# Altium footprint library SensorCard.PcbLib: 61 footprints (part 3 of 4)
Each footprint in its own frame and in the unit in brackets; x right, y up, seen from the top. Pads: shape width x height; smd on the part's side, far side on the other; paste and mask are expansions set on the pad; w line width, h text height; cw(c..) or ccw(c..) is an arc to the next point about the centre after c.
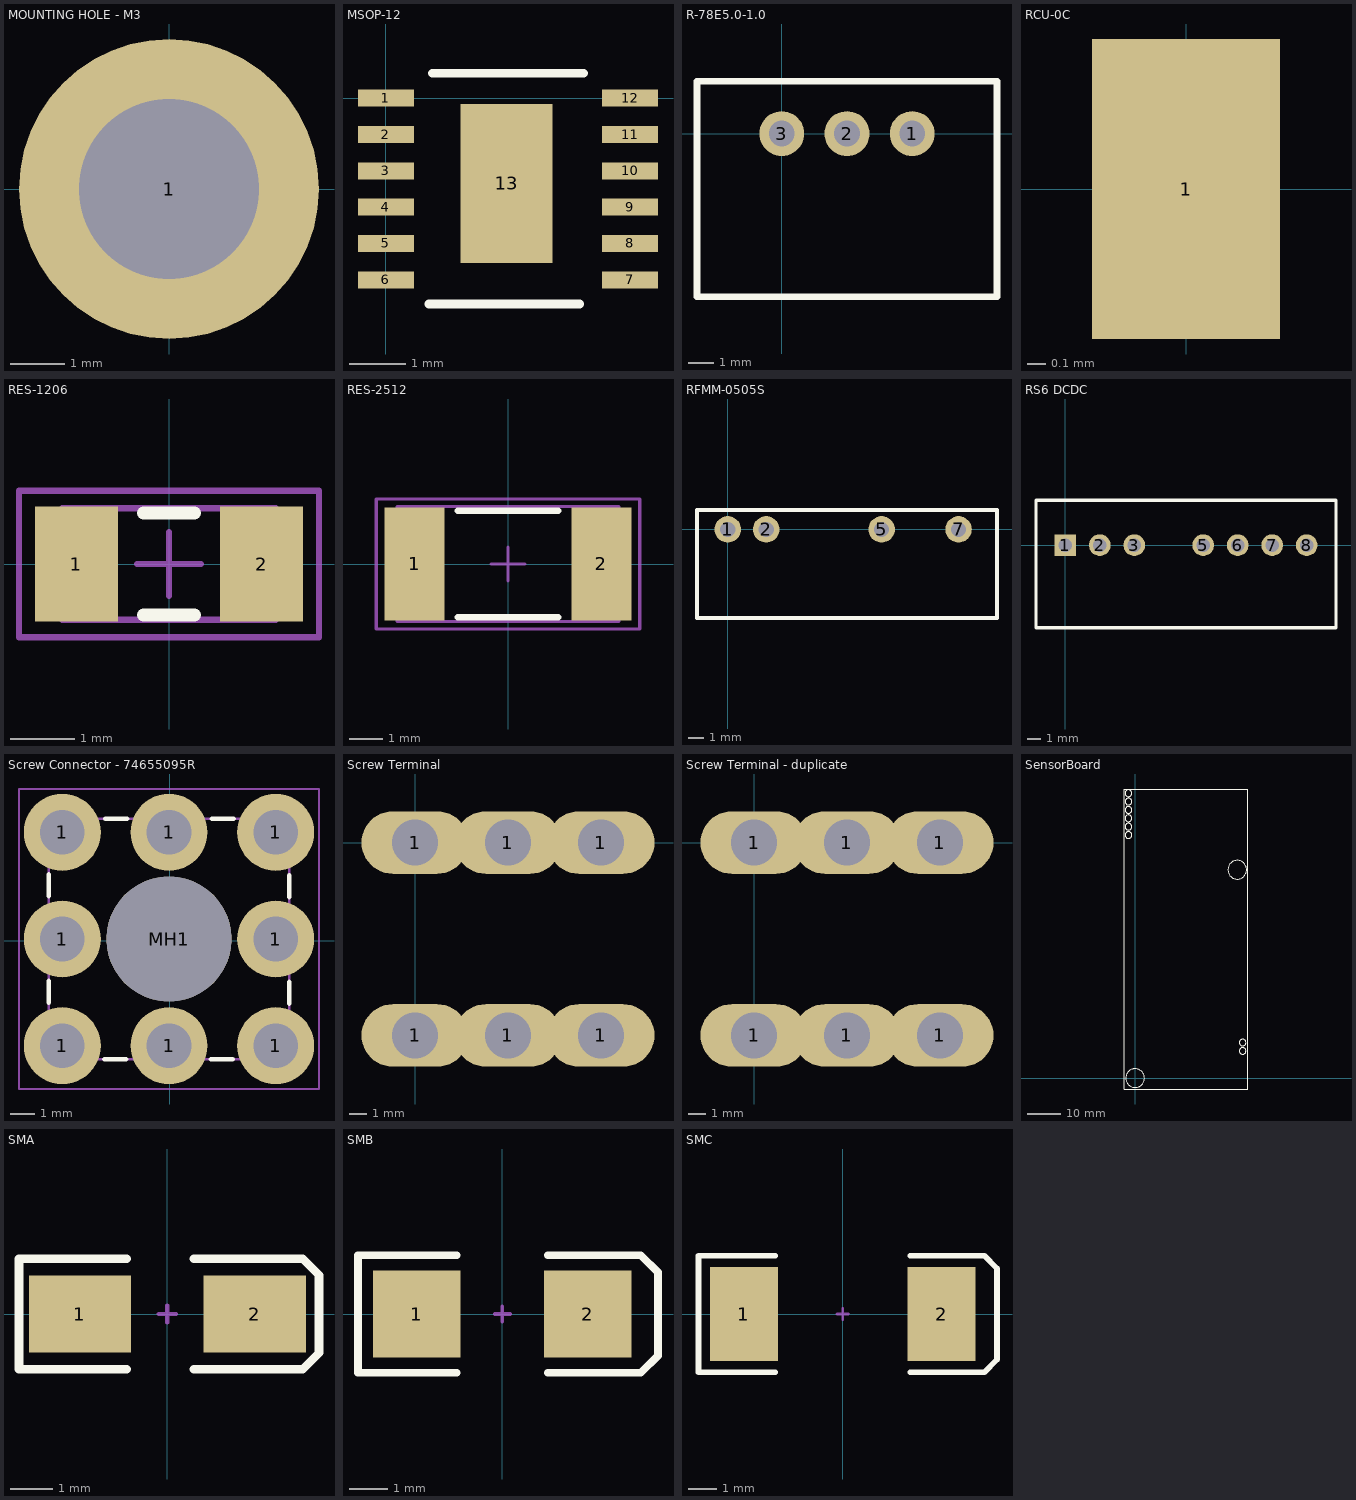
[diagram p2: the footprints below, top view; thin cyan lines are the x and y axes]

## MOUNTING HOLE - M3 [mm]
pads (1):
  round 5.5 hole 3.3: 1(0,0)

## MSOP-12 [mm]
pads (13):
  rect 1x0.305 smd paste+0: 1(0,0) 2(0,-0.65) 3(0,-1.3) 4(0,-1.95) 5(0,-2.6) 6(0,-3.25) 7(4.369,-3.25) 8(4.369,-2.6) 9(4.369,-1.95) 10(4.369,-1.3) 11(4.369,-0.65) 12(4.369,0)
  rect 1.651x2.845 smd paste+0: 13(2.159,-1.524)
Top Overlay:
  lines w0.152: 0.762,-3.683 3.473,-3.683 ; 0.829,0.446 3.54,0.446
  text "." at -0.127,0.254 h1.78
3D body "User Library-msop-12.step": height 1.1, standoff 0, extent -0.27,-3.62 4.63,0.42
3D body: height 0.25, standoff 0, extent 2.184,-1.751 2.438,-1.497

## R-78E5.0-1.0 [mm] "DC/DC Converter"
height 10.4
pads (3):
  round 1.75 hole 1: 1(5.08,0) 2(2.54,0) 3(0,0)
Top Overlay:
  lines w0.254: -3.302,-6.35 -3.302,2.032 8.382,2.032 8.382,-6.35 -3.302,-6.35
3D body: height 10.4, standoff 0, extent -3.175,-6.223 8.255,1.905

## RCU-0C [mm] "0603 PROBE PAD"
pads (1):
  rect 1x1.6 smd: 1(0,0)
3D body "c-1625854-3-ba-3d.stp": height 1.12, standoff -0.03, extent -0.443,-0.8 0.457,0.8

## RES-1206 [mm] "Chip Resistor, Body 3.2x1.6mm, IPC Medium Density"
height 0.71
pads (2):
  rect 1.3x1.8 smd: 1(-1.45,0) 2(1.45,0)
Top Overlay:
  lines w0.2: -0.4,-0.8 0.4,-0.8 ; -0.4,0.8 0.4,0.8
Mechanical 13:
  lines w0.1: -1.675,-0.875 1.675,-0.875 1.675,0.875 -1.675,0.875 -1.675,-0.875
Mechanical 15:
  lines w0.1: -0.5,0 0.5,0 ; 0,-0.5 0,0.5 ; -2.35,-1.15 2.35,-1.15 2.35,1.15 -2.35,1.15 -2.35,-1.15
3D body "User Library-CR3216-1206.step": height 0.6, standoff 0, extent -1.6,-0.8 1.6,0.8

## RES-2512 [mm] "Chip Resistor, Body 6.4x3.2mm, IPC Medium Density"
height 1.1
pads (2):
  rect 1.8x3.4 smd: 1(-2.8,0) 2(2.8,0)
Top Overlay:
  lines w0.2: -1.5,-1.6 1.5,-1.6 ; -1.5,1.6 1.5,1.6
Mechanical 13:
  lines w0.1: -3.325,-1.725 -3.325,1.725 3.325,1.725 3.325,-1.725 -3.325,-1.725
Mechanical 15:
  lines w0.1: -0.5,0 0.5,0 ; 0,-0.5 0,0.5 ; -3.95,-1.95 -3.95,1.95 3.95,1.95 3.95,-1.95 -3.95,-1.95
3D body "RESC-2512.STEP": height 0.57, standoff -0.03, extent -3.15,-1.626 3.15,1.524

## RFMM-0505S [mm] "DC/DC Converter"
height 10.4
pads (4):
  round 1.75 hole 1: 1(0,0) 2(2.54,0) 5(10.16,0) 7(15.24,0)
Top Overlay:
  lines w0.254: -2.032,-5.842 17.78,-5.842 17.78,1.27 -2.032,1.27 -2.032,-5.842
3D body: height 10.2, standoff 0, extent -2.032,-5.842 17.78,1.27

## RS6 DCDC [mm]
pads (7):
  rect 1.6x1.6 hole 1: 1(0,0)
  round 1.6 hole 1: 2(2.54,0) 3(5.08,0) 5(10.16,0) 6(12.7,0) 7(15.24,0) 8(17.78,0)
Top Overlay:
  lines w0.254: -2.159,-6.08 19.939,-6.08 19.939,3.3 -2.159,3.3 -2.159,-6.08
3D body: height 11.1, standoff 0, extent -2.032,-5.969 19.812,3.175

## Screw Connector - 74655095R [mm] "8 Pin Screw Terminal, Power Tap M5 Through Hole"
pads (9):
  round 3.2 hole 1.85: 1(-4.46,-4.359) 1(-4.46,0.076) 1(-4.46,4.511) 1(-0.025,-4.359) 1(-0.025,4.511) 1(4.41,-4.359) 1(4.41,0.076) 1(4.41,4.511)
  round 5.2 hole 5.2 unplated: MH1(-0.025,0.076)
Top Overlay:
  lines w0.2: -5.025,-2.574 -5.025,-1.674 ; -5.025,1.861 -5.025,2.761 ; -2.71,-4.924 -1.81,-4.924 ; -2.675,5.076 -1.775,5.076 ; 1.725,-4.924 2.625,-4.924 ; 1.76,5.076 2.66,5.076 ; 4.975,-2.609 4.975,-1.709 ; 4.975,1.826 4.975,2.726
Top Paste:
  drawing of 8 lines, arcs and shapes, not listed
Mechanical 11:
  lines w0.1: -5.025,-4.924 -5.025,5.076 4.975,5.076 4.975,-4.924 -5.025,-4.924
Mechanical 13:
  lines w0.1: -5.025,-4.924 4.975,-4.924 4.975,5.076 -5.025,5.076 -5.025,-4.924
Mechanical 15:
  lines w0.1: -0.525,0.076 0.475,0.076 ; -0.025,-0.424 -0.025,0.576 ; -6.26,-6.159 -6.26,6.311 6.21,6.311 6.21,-6.159 -6.26,-6.159
3D body "74655095.stp": height 4.03, standoff -2.47, extent -5.025,-4.924 4.975,5.076

## Screw Terminal [mm] "6 Pin Screw Terminal, Power Tap 10-32 Through Hole"
pads (6):
  oval 6x3.5 hole 2.57: 1(0,-10.8) 1(0,0) 1(5.2,-10.8) 1(5.2,0) 1(10.41,-10.8) 1(10.41,0)
3D body "keystone-PN7787.STEP": height 13.02, standoff -4, extent -0.762,-12.319 11.176,1.397

## Screw Terminal - duplicate [mm] "6 Pin Screw Terminal, Power Tap 10-32 Through Hole"
pads (6):
  oval 6x3.5 hole 2.57: 1(0,-10.8) 1(0,0) 1(5.2,-10.8) 1(5.2,0) 1(10.41,-10.8) 1(10.41,0)
3D body "keystone-PN7787.STEP": height 13.02, standoff -4, extent -0.762,-12.319 11.176,1.397

## SensorBoard [mm]
Top Overlay:
  circle w0.254: c-2.032,73.787 r1.016
  circle w0.254: c-2.032,76.327 r1.016
  circle w0.254: c-2.032,78.867 r1.016
  circle w0.254: c-2.032,81.407 r1.016
  circle w0.254: c-2.032,83.947 r1.016
  circle w0.254: c-2.032,86.487 r1.016
  circle w0.254: c0,0 r2.84
  circle w0.254: c32.639,8.255 r1.016
  circle w0.254: c32.639,10.795 r1.016
  circle w0.254: c30.988,63.246 r2.84
  lines w0.254: -3.302,69.977 -3.302,87.757 ; -0.762,87.757 -3.302,87.757 ; -3.302,87.757 34.163,87.757 34.163,-3.302 -3.302,-3.302 -3.302,87.757
3D body "CurrentSensorBoard.step": height 37.46, standoff 0.09, extent -3.175,-3.175 34.036,87.63

## SensorBoard_t [mm]
3D body: height 28.46, standoff -8.9, extent -28.702,-30.607 -28.702,-30.607

## SMA [mm] "DO-214-AC/SMA; 2 C-Bend Leads; Body 5 x 2.7 mm, inc. leads (LxW)"
height 2.44
pads (2):
  rect 2.4x1.8 smd: 1(-2.05,0) 2(2.05,0)
Top Overlay:
  lines w0.2: -0.95,-1.3 -3.48,-1.3 -3.48,1.3 -0.95,1.3 ; 0.62,-1.3 3.17,-1.3 3.556,-0.914 3.556,0.914 3.17,1.3 0.62,1.3
Mechanical 1:
  lines w0.1: -0.2,0 0.2,0 ; 0,-0.2 0,0.2
3D body: height 2.29, standoff 0, extent -2.159,-1.27 2.286,1.27

## SMB [mm] "DO-214-AA/SMB; 2 C-Bend Leads; Body 5.3 x 3.6 mm, inc. leads (LxW)"
height 2.54
pads (2):
  rect 2.3x2.3 smd: 1(-2.25,0) 2(2.25,0)
Top Overlay:
  lines w0.2: -1.2,-1.55 -3.8,-1.55 -3.8,1.55 -1.2,1.55 ; 1.2,-1.55 3.65,-1.55 4.1,-1.1 4.1,1.1 3.65,1.55 1.2,1.55
Mechanical 1:
  lines w0.1: -0.2,0 0.2,0 ; 0,-0.2 0,0.2

## SMC [mm] "DO-214-AB/SMC; 2 C-Bend Leads; Body 7.9 x 5.9 mm, inc. leads (LxW)"
height 2.65
pads (2):
  rect 2.4x3.3 smd: 1(-3.475,0) 2(3.475,0)
Top Overlay:
  lines w0.2: -2.375,-2.05 -5.075,-2.05 -5.075,2.05 -2.375,2.05 ; 2.375,-2.05 4.975,-2.05 5.425,-1.6 5.425,1.6 4.975,2.055 ; 2.375,2.05 4.975,2.05
Mechanical 1:
  lines w0.1: -0.2,0 0.2,0 ; 0,-0.2 0,0.2